# Altium integrated library Connectors.IntLib: 512 symbols (part 1 of 2)
Pins are listed as number, name and electrical type; pins without a type are passive.

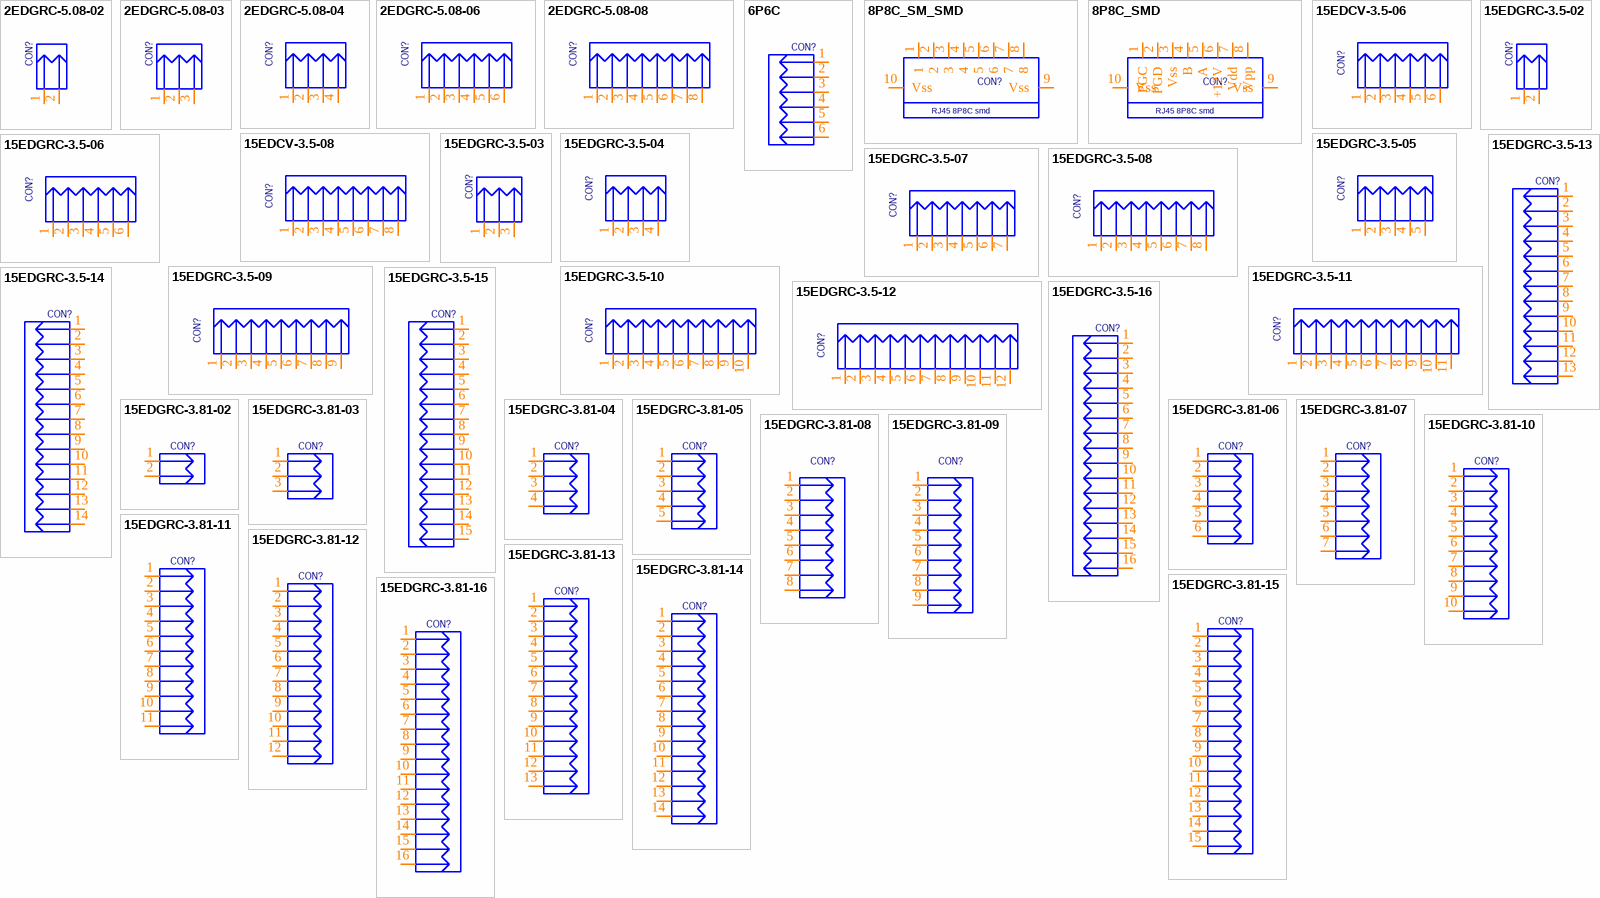
[diagram p0: symbols 2EDGRC-5.08-02 to 15EDGRC-3.81-16]

## 2EDGRC-5.08-02
designator CON?  (value not drawn)
Value: 2EDGRC-5.08-02; Pricing Аlternative: 0.006; Note: Connector; Temp.Characteristic: -40C to +85C; Voltage: 300 V; Package / Case: 5.08 mm; PartNumber Digi-Key: 2EDGRC-5.08-02; Pricing Digi-Key: 0.064; Publisher: Catcatcat Electronics; Website developer: http://catcatcat.d-lan.dp.ua/; Assembly type: Manual Part
footprint 8113/S02-D
pins: 1, 2

## 2EDGRC-5.08-03
designator CON?  (value not drawn)
Value: 2EDGRC-5.08-03; Note: Connector; Temp.Characteristic: -40C to +85C; Voltage: 300 V; Package / Case: 5.08 mm; PartNumber Digi-Key: 2EDGRC-5.08-03; Pricing Digi-Key: 0.10; Publisher: Catcatcat Electronics; Website developer: http://catcatcat.d-lan.dp.ua/; Assembly type: Manual Part
footprint 8113/S03-D
pins: 1, 2, 3

## 2EDGRC-5.08-04
designator CON?  (value not drawn)
Value: 2EDGRC-5.08-04; Note: Connector; Temp.Characteristic: -40C to +85C; Voltage: 300 V; Package / Case: 5.08 mm; PartNumber Digi-Key: 2EDGRC-5.08-04; Pricing Digi-Key: 0.15; Publisher: Catcatcat Electronics; Website developer: http://catcatcat.d-lan.dp.ua/; Assembly type: Manual Part
footprint 8113/S04-D
pins: 1, 2, 3, 4

## 2EDGRC-5.08-06
designator CON?  (value not drawn)
Value: 2EDGRC-5.08-06; Pricing Аlternative: 0.02; Note: Connector; Temp.Characteristic: -40C to +85C; Voltage: 300 V; Dealer Аlternative: http://www.kosmodrom.com.ua; Package / Case: 5.08 mm; PartNumber Digi-Key: 2EDGRC-5.08-06; Pricing Digi-Key: 0.21; Publisher: Catcatcat Electronics; Website developer: http://catcatcat.d-lan.dp.ua/; Assembly type: Manual Part
footprint 8113/S06-D_2+2+2
footprint 8113/S06-D_3+3
pins: 1, 2, 3, 4, 5, 6

## 2EDGRC-5.08-08
designator CON?  (value not drawn)
Value: 2EDGRC-5.08-08; Note: Connector; Temp.Characteristic: -40C to +85C; Voltage: 300 V; Package / Case: 5.08 mm; PartNumber Digi-Key: 2EDGRC-5.08-08; Publisher: Catcatcat Electronics; Website developer: http://catcatcat.d-lan.dp.ua/; Assembly type: Manual Part
footprint 8113/S08-D_2+2+2+2
pins: 1, 2, 3, 4, 5, 6, 7, 8

## 6P6C
designator CON?  (value not drawn)
Note: Connector; Temp.Characteristic: -40C to +85C; Value: *; Publisher: Catcatcat Electronics; Website developer: http://catcatcat.d-lan.dp.ua/; Assembly type: Manual Part
footprint 6P6C
pins: 1, 2, 3, 4, 5, 6

## 8P8C_SM_SMD
designator CON?  (value not drawn)
Note: Connector; Temp.Characteristic: -40C to +85C; Value: *; Publisher: Catcatcat Electronics; Website developer: http://catcatcat.d-lan.dp.ua/; Assembly type: Manual Part
footprint 8P8C_SMD
pins: 1, 2, 3, 4, 5, 6, 7, 8, 9 Vss, 10 Vss
text: RJ45 8P8C smd

## 8P8C_SMD
designator CON?  (value not drawn)
Note: Connector; Temp.Characteristic: -40C to +85C; Value: *; Publisher: Catcatcat Electronics; Website developer: http://catcatcat.d-lan.dp.ua/; Assembly type: Manual Part
footprint 8P8C_SMD
pins: 1 PGC, 2 PGD, 3 Vss, 4 B, 5 A, 6 +12V, 7 Vdd, 8 Vpp, 9 Vss, 10 Vss
text: RJ45 8P8C smd

## 15EDCV-3.5-06
designator CON?  (value not drawn)
Value: 15EDCV-3.5-06; Note: Connector; Temp.Characteristic: -40C to +85C; Package / Case: 3.5 mm; PartNumber Digi-Key: 15EDCV-3.5-06; Publisher: Catcatcat Electronics; Website developer: http://catcatcat.d-lan.dp.ua/; Assembly type: Manual Part
footprint 15EDCV-3.5-06
pins: 1, 2, 3, 4, 5, 6

## 15EDCV-3.5-08
designator CON?  (value not drawn)
Value: 15EDCV-3.5-08; Note: Connector; Temp.Characteristic: -40C to +85C; Package / Case: 3.5 mm; PartNumber Digi-Key: 15EDCV-3.5-08; Publisher: Catcatcat Electronics; Website developer: http://catcatcat.d-lan.dp.ua/; Assembly type: Manual Part
footprint 15EDCV-3.5-08
pins: 1, 2, 3, 4, 5, 6, 7, 8

## 15EDGRC-3.5-02
designator CON?  (value not drawn)
300 V 8 A; Value: 15EDGR-3.5-02; Pricing Аlternative: 0.013; Note: Connector; Temp.Characteristic: -40C to +85C; ComponentLink2URL: http://www.kosmodrom.com.ua/pdf/15EDGRC-35.pdf; Dealer Digi-Key: https://detail.1688.com/offer/539193088710.html; Package / Case: 3.5 mm; PartNumber Digi-Key: 15EDGR-3.5-02; Pricing Digi-Key: 0.0506; Publisher: Catcatcat Electronics; Voltage: 300 V 8 A; Website developer: http://catcatcat.d-lan.dp.ua/; Assembly type: Manual Part
footprint 15EDGR-3.5-02
pins: 1, 2

## 15EDGRC-3.5-03
designator CON?  (value not drawn)
300 V 8 A; Value: 15EDGR-3.5-03; Pricing Аlternative: 0.020; Note: Connector; Temp.Characteristic: -40C to +85C; ComponentLink2URL: http://www.kosmodrom.com.ua/pdf/15EDGRC-35.pdf; Dealer Digi-Key: https://detail.1688.com/offer/539192620837.html; Package / Case: 3.5 mm; PartNumber Digi-Key: 15EDGR-3.5-03; Pricing Digi-Key: 0.077; Publisher: Catcatcat Electronics; Voltage: 300 V 8 A; Website developer: http://catcatcat.d-lan.dp.ua/; Assembly type: Manual Part
footprint 15EDGR-3.5-03
pins: 1, 2, 3

## 15EDGRC-3.5-04
designator CON?  (value not drawn)
300 V 8 A; Value: 15EDGR-3.5-04; Note: Connector; Temp.Characteristic: -40C to +85C; Package / Case: 3.5 mm; PartNumber Digi-Key: 15EDGR-3.5-04; Publisher: Catcatcat Electronics; Voltage: 300 V 8 A; Website developer: http://catcatcat.d-lan.dp.ua/; Assembly type: Manual Part
footprint 15EDGR-3.5-04
pins: 1, 2, 3, 4

## 15EDGRC-3.5-05
designator CON?  (value not drawn)
300 V 8 A; Value: 15EDGR-3.5-05; Note: Connector; Temp.Characteristic: -40C to +85C; Package / Case: 3.5 mm; PartNumber Digi-Key: 15EDGR-3.5-05; Publisher: Catcatcat Electronics; Voltage: 300 V 8 A; Website developer: http://catcatcat.d-lan.dp.ua/; Assembly type: Manual Part
footprint 15EDGR-3.5-05
pins: 1, 2, 3, 4, 5

## 15EDGRC-3.5-06
designator CON?  (value not drawn)
300 V 8 A; Value: 15EDGR-3.5-06; Pricing Аlternative: 0.026; Note: Connector; Temp.Characteristic: -40C to +85C; ComponentLink1URL: http://www.nb-lf.com/en/index.asp; Dealer Digi-Key: https://detail.1688.com/offer/44273896500.html; Package / Case: 3.5 mm; PartNumber Digi-Key: 15EDGR-3.5-06; Pricing Digi-Key: 0.18; Publisher: Catcatcat Electronics; Voltage: 300 V 8 A; Website developer: http://catcatcat.d-lan.dp.ua/; Assembly type: Manual Part
footprint 15EDGR-3.5-06
pins: 1, 2, 3, 4, 5, 6

## 15EDGRC-3.5-07
designator CON?  (value not drawn)
300 V 8 A; Value: 15EDGR-3.5-07; Note: Connector; Temp.Characteristic: -40C to +85C; Package / Case: 3.5 mm; PartNumber Digi-Key: 15EDGR-3.5-07; Publisher: Catcatcat Electronics; Voltage: 300 V 8 A; Website developer: http://catcatcat.d-lan.dp.ua/; Assembly type: Manual Part
footprint 15EDGR-3.5-07
pins: 1, 2, 3, 4, 5, 6, 7

## 15EDGRC-3.5-08
designator CON?  (value not drawn)
300 V 8 A; Value: 15EDGR-3.5-08; Pricing Аlternative: 0.054; Note: Connector; Temp.Characteristic: -40C to +85C; Dealer Digi-Key: https://detail.1688.com/offer/40548719322.html; Package / Case: 3.5 mm; PartNumber Digi-Key: 15EDGR-3.5-08; Pricing Digi-Key: 0.29; Publisher: Catcatcat Electronics; Voltage: 300 V 8 A; Website developer: http://catcatcat.d-lan.dp.ua/; Assembly type: Manual Part
footprint 15EDGR-3.5-08
pins: 1, 2, 3, 4, 5, 6, 7, 8

## 15EDGRC-3.5-09
designator CON?  (value not drawn)
300 V 8 A; Value: 15EDGR-3.5-09; Note: Connector; Temp.Characteristic: -40C to +85C; Package / Case: 3.5 mm; PartNumber Digi-Key: 15EDGR-3.5-09; Publisher: Catcatcat Electronics; Voltage: 300 V 8 A; Website developer: http://catcatcat.d-lan.dp.ua/; Assembly type: Manual Part
footprint 15EDGR-3.5-09
pins: 1, 2, 3, 4, 5, 6, 7, 8, 9

## 15EDGRC-3.5-10
designator CON?  (value not drawn)
300 V 8 A; Value: 15EDGRC-3.5-10; Pricing Аlternative: 0.054; Note: Connector; Temp.Characteristic: -40C to +85C; Package / Case: 3.5 mm; PartNumber Digi-Key: 15EDGR-3.5-10; Pricing Digi-Key: 0.31; Publisher: Catcatcat Electronics; Voltage: 300 V 8 A; Website developer: http://catcatcat.d-lan.dp.ua/; Assembly type: Manual Part
footprint 15EDGR-3.5-10
pins: 1, 2, 3, 4, 5, 6, 7, 8, 9, 10

## 15EDGRC-3.5-11
designator CON?  (value not drawn)
300 V 8 A; Value: 15EDGR-3.5-11; Note: Connector; Temp.Characteristic: -40C to +85C; Package / Case: 3.5 mm; PartNumber Digi-Key: 15EDGR-3.5-11; Publisher: Catcatcat Electronics; Voltage: 300 V 8 A; Website developer: http://catcatcat.d-lan.dp.ua/; Assembly type: Manual Part
footprint 15EDGR-3.5-11
pins: 1, 2, 3, 4, 5, 6, 7, 8, 9, 10, 11

## 15EDGRC-3.5-12
designator CON?  (value not drawn)
300 V 8 A; Value: 15EDGR-3.5-12; Note: Connector; Temp.Characteristic: -40C to +85C; Package / Case: 3.5 mm; PartNumber Digi-Key: 15EDGR-3.5-12; Publisher: Catcatcat Electronics; Voltage: 300 V 8 A; Website developer: http://catcatcat.d-lan.dp.ua/; Assembly type: Manual Part
footprint 15EDGR-3.5-12
pins: 1, 2, 3, 4, 5, 6, 7, 8, 9, 10, 11, 12

## 15EDGRC-3.5-13
designator CON?  (value not drawn)
Value: 15EDGR-3.5-13; Note: Connector; Temp.Characteristic: -40C to +85C; Package / Case: 3.5 mm; PartNumber Digi-Key: 15EDGR-3.5-13; Publisher: Catcatcat Electronics; Website developer: http://catcatcat.d-lan.dp.ua/; Assembly type: Manual Part
footprint 15EDGR-3.5-13
pins: 1, 2, 3, 4, 5, 6, 7, 8, 9, 10, 11, 12, 13

## 15EDGRC-3.5-14
designator CON?  (value not drawn)
Value: 15EDGR-3.5-14; Note: Connector; Temp.Characteristic: -40C to +85C; Package / Case: 3.5 mm; PartNumber Digi-Key: 15EDGR-3.5-14; Publisher: Catcatcat Electronics; Website developer: http://catcatcat.d-lan.dp.ua/; Assembly type: Manual Part
footprint 15EDGR-3.5-14
pins: 1, 2, 3, 4, 5, 6, 7, 8, 9, 10, 11, 12, 13, 14

## 15EDGRC-3.5-15
designator CON?  (value not drawn)
Value: 15EDGR-3.5-15; Note: Connector; Temp.Characteristic: -40C to +85C; Package / Case: 3.5 mm; PartNumber Digi-Key: 15EDGR-3.5-15; Publisher: Catcatcat Electronics; Website developer: http://catcatcat.d-lan.dp.ua/; Assembly type: Manual Part
footprint 15EDGR-3.5-15
pins: 1, 2, 3, 4, 5, 6, 7, 8, 9, 10, 11, 12, 13, 14, 15

## 15EDGRC-3.5-16
designator CON?  (value not drawn)
Value: 15EDGR-3.5-16; Note: Connector; Temp.Characteristic: -40C to +85C; Package / Case: 3.5 mm; PartNumber Digi-Key: 15EDGR-3.5-16; Publisher: Catcatcat Electronics; Website developer: http://catcatcat.d-lan.dp.ua/; Assembly type: Manual Part
footprint 15EDGR-3.5-16
pins: 1, 2, 3, 4, 5, 6, 7, 8, 9, 10, 11, 12, 13, 14, 15, 16

## 15EDGRC-3.81-02
designator CON?  (value not drawn)
Note: Connector; Temp.Characteristic: -40C to +85C; Value: *; Publisher: Catcatcat Electronics; Website developer: http://catcatcat.d-lan.dp.ua/; Assembly type: Manual Part
footprint 15EDGR-3.81-02
pins: 1, 2

## 15EDGRC-3.81-03
designator CON?  (value not drawn)
Note: Connector; Temp.Characteristic: -40C to +85C; Value: *; Publisher: Catcatcat Electronics; Website developer: http://catcatcat.d-lan.dp.ua/; Assembly type: Manual Part
footprint 15EDGR-3.81-03
pins: 1, 2, 3

## 15EDGRC-3.81-04
designator CON?  (value not drawn)
Note: Connector; Temp.Characteristic: -40C to +85C; Value: *; Publisher: Catcatcat Electronics; Website developer: http://catcatcat.d-lan.dp.ua/; Assembly type: Manual Part
footprint 15EDGR-3.81-04
pins: 1, 2, 3, 4

## 15EDGRC-3.81-05
designator CON?  (value not drawn)
Note: Connector; Temp.Characteristic: -40C to +85C; Value: *; Publisher: Catcatcat Electronics; Website developer: http://catcatcat.d-lan.dp.ua/; Assembly type: Manual Part
footprint 15EDGR-3.81-05
pins: 1, 2, 3, 4, 5

## 15EDGRC-3.81-06
designator CON?  (value not drawn)
Note: Connector; Temp.Characteristic: -40C to +85C; Value: *; Publisher: Catcatcat Electronics; Website developer: http://catcatcat.d-lan.dp.ua/; Assembly type: Manual Part
footprint 15EDGR-3.81-06
pins: 1, 2, 3, 4, 5, 6

## 15EDGRC-3.81-07
designator CON?  (value not drawn)
Note: Connector; Temp.Characteristic: -40C to +85C; Value: *; Publisher: Catcatcat Electronics; Website developer: http://catcatcat.d-lan.dp.ua/; Assembly type: Manual Part
footprint 15EDGR-3.81-07
pins: 1, 2, 3, 4, 5, 6, 7

## 15EDGRC-3.81-08
designator CON?  (value not drawn)
Note: Connector; Temp.Characteristic: -40C to +85C; Value: *; Publisher: Catcatcat Electronics; Website developer: http://catcatcat.d-lan.dp.ua/; Assembly type: Manual Part
footprint 15EDGR-3.81-08
pins: 1, 2, 3, 4, 5, 6, 7, 8

## 15EDGRC-3.81-09
designator CON?  (value not drawn)
Note: Connector; Temp.Characteristic: -40C to +85C; Value: *; Publisher: Catcatcat Electronics; Website developer: http://catcatcat.d-lan.dp.ua/; Assembly type: Manual Part
footprint 15EDGR-3.81-09
pins: 1, 2, 3, 4, 5, 6, 7, 8, 9

## 15EDGRC-3.81-10
designator CON?  (value not drawn)
Note: Connector; Temp.Characteristic: -40C to +85C; Value: *; Publisher: Catcatcat Electronics; Website developer: http://catcatcat.d-lan.dp.ua/; Assembly type: Manual Part
footprint 15EDGR-3.81-10
pins: 1, 2, 3, 4, 5, 6, 7, 8, 9, 10

## 15EDGRC-3.81-11
designator CON?  (value not drawn)
Note: Connector; Temp.Characteristic: -40C to +85C; Value: *; Publisher: Catcatcat Electronics; Website developer: http://catcatcat.d-lan.dp.ua/; Assembly type: Manual Part
footprint 15EDGR-3.81-11
pins: 1, 2, 3, 4, 5, 6, 7, 8, 9, 10, 11

## 15EDGRC-3.81-12
designator CON?  (value not drawn)
Note: Connector; Temp.Characteristic: -40C to +85C; Value: *; Publisher: Catcatcat Electronics; Website developer: http://catcatcat.d-lan.dp.ua/; Assembly type: Manual Part
footprint 15EDGR-3.81-12
pins: 1, 2, 3, 4, 5, 6, 7, 8, 9, 10, 11, 12

## 15EDGRC-3.81-13
designator CON?  (value not drawn)
Note: Connector; Temp.Characteristic: -40C to +85C; Value: *; Publisher: Catcatcat Electronics; Website developer: http://catcatcat.d-lan.dp.ua/; Assembly type: Manual Part
footprint 15EDGR-3.81-13
pins: 1, 2, 3, 4, 5, 6, 7, 8, 9, 10, 11, 12, 13

## 15EDGRC-3.81-14
designator CON?  (value not drawn)
Note: Connector; Temp.Characteristic: -40C to +85C; Value: *; Publisher: Catcatcat Electronics; Website developer: http://catcatcat.d-lan.dp.ua/; Assembly type: Manual Part
footprint 15EDGR-3.81-14
pins: 1, 2, 3, 4, 5, 6, 7, 8, 9, 10, 11, 12, 13, 14

## 15EDGRC-3.81-15
designator CON?  (value not drawn)
Note: Connector; Temp.Characteristic: -40C to +85C; Value: *; Publisher: Catcatcat Electronics; Website developer: http://catcatcat.d-lan.dp.ua/; Assembly type: Manual Part
footprint 15EDGR-3.81-15
pins: 1, 2, 3, 4, 5, 6, 7, 8, 9, 10, 11, 12, 13, 14, 15

## 15EDGRC-3.81-16
designator CON?  (value not drawn)
Note: Connector; Temp.Characteristic: -40C to +85C; Value: *; Publisher: Catcatcat Electronics; Website developer: http://catcatcat.d-lan.dp.ua/; Assembly type: Manual Part
footprint 15EDGR-3.81-16
pins: 1, 2, 3, 4, 5, 6, 7, 8, 9, 10, 11, 12, 13, 14, 15, 16

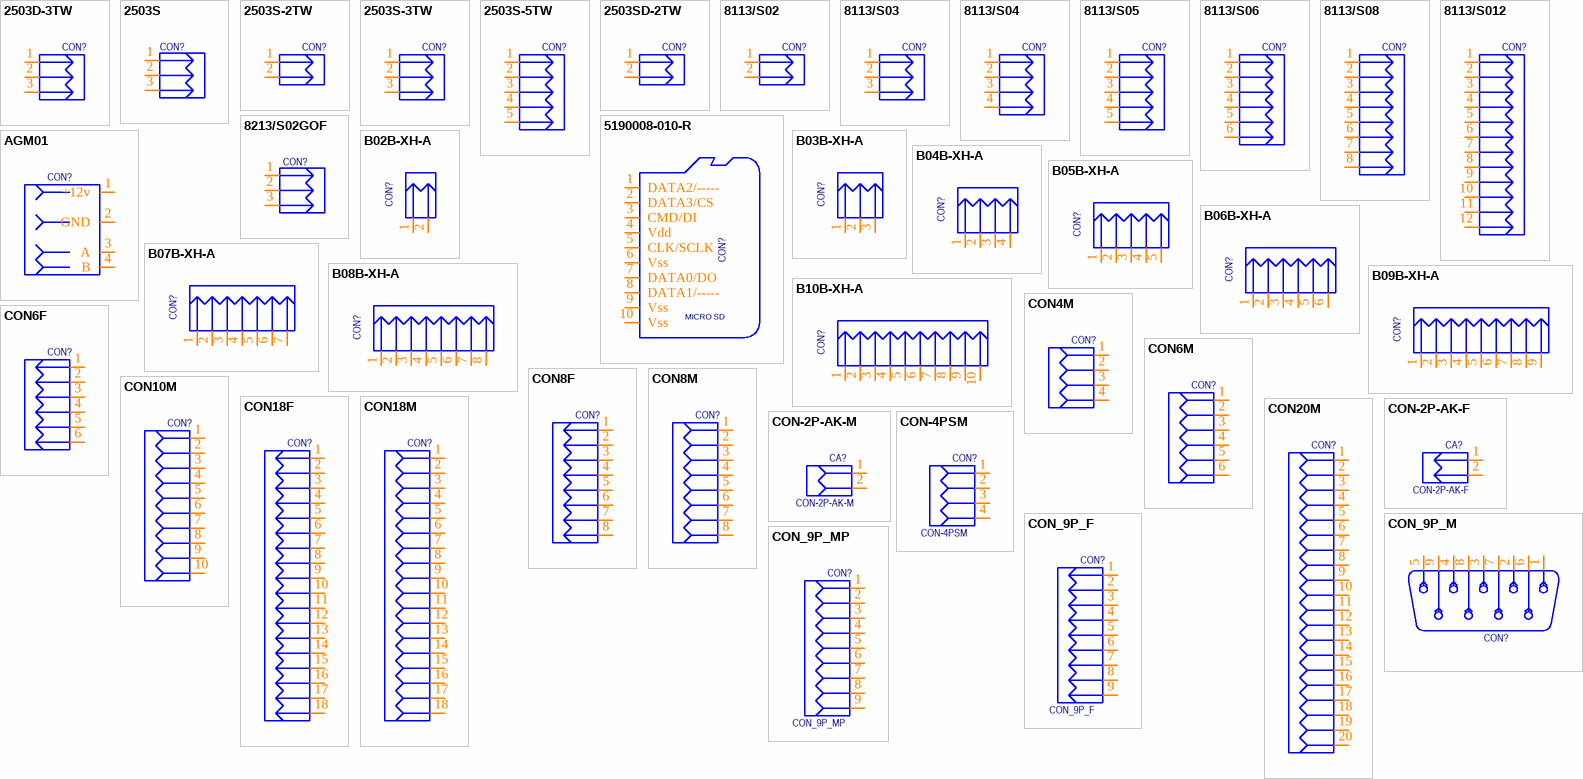
[diagram p1: symbols 2503D-3TW to CON_9P_MP]

## 2503D-3TW
designator CON?  (value not drawn)
Note: Connector; Temp.Characteristic: -40C to +85C; Value: *; Publisher: Catcatcat Electronics; Website developer: http://catcatcat.d-lan.dp.ua/; Assembly type: Manual Part
footprint 2503D-3TW
pins: 1, 2, 3

## 2503S
designator CON?  (value not drawn)
Note: Connector; Temp.Characteristic: -40C to +85C; Value: *; Publisher: Catcatcat Electronics; Website developer: http://catcatcat.d-lan.dp.ua/; Assembly type: Manual Part
footprint 2503S
pins: 1, 2, 3

## 2503S-2TW
designator CON?  (value not drawn)
Note: Connector; Temp.Characteristic: -40C to +85C; Value: *; Publisher: Catcatcat Electronics; Website developer: http://catcatcat.d-lan.dp.ua/; Assembly type: Manual Part
footprint 2503S-2TW
pins: 1, 2

## 2503S-3TW
designator CON?  (value not drawn)
Note: Connector; Temp.Characteristic: -40C to +85C; Value: *; Publisher: Catcatcat Electronics; Website developer: http://catcatcat.d-lan.dp.ua/; Assembly type: Manual Part
footprint 2503S-3TW
pins: 1, 2, 3

## 2503S-5TW
designator CON?  (value not drawn)
Note: Connector; Temp.Characteristic: -40C to +85C; Value: *; Publisher: Catcatcat Electronics; Website developer: http://catcatcat.d-lan.dp.ua/; Assembly type: Manual Part
footprint 2503S-5TW
pins: 1, 2, 3, 4, 5

## 2503SD-2TW
designator CON?  (value not drawn)
Note: Connector; Temp.Characteristic: -40C to +85C; Value: *; Publisher: Catcatcat Electronics; Website developer: http://catcatcat.d-lan.dp.ua/; Assembly type: Manual Part
footprint 2503SD-2TW
pins: 1, 2

## 8113/S02
designator CON?  (value not drawn)
Note: Connector; Temp.Characteristic: -40C to +85C; Value: *; Publisher: Catcatcat Electronics; Website developer: http://catcatcat.d-lan.dp.ua/; Assembly type: Manual Part
footprint 8113/S02
pins: 1, 2

## 8113/S03
designator CON?  (value not drawn)
Note: Connector; Temp.Characteristic: -40C to +85C; Value: *; Publisher: Catcatcat Electronics; Website developer: http://catcatcat.d-lan.dp.ua/; Assembly type: Manual Part
footprint 8113/S03
pins: 1, 2, 3

## 8113/S04
designator CON?  (value not drawn)
Note: Connector; Temp.Characteristic: -40C to +85C; Value: *; Publisher: Catcatcat Electronics; Website developer: http://catcatcat.d-lan.dp.ua/; Assembly type: Manual Part
footprint 8113/S04
pins: 1, 2, 3, 4

## 8113/S05
designator CON?  (value not drawn)
Note: Connector; Temp.Characteristic: -40C to +85C; Value: *; Publisher: Catcatcat Electronics; Website developer: http://catcatcat.d-lan.dp.ua/; Assembly type: Manual Part
footprint 8113/S05
pins: 1, 2, 3, 4, 5

## 8113/S06
designator CON?  (value not drawn)
Note: Connector; Temp.Characteristic: -40C to +85C; Value: *; Publisher: Catcatcat Electronics; Website developer: http://catcatcat.d-lan.dp.ua/; Assembly type: Manual Part
footprint 8113/S06
pins: 1, 2, 3, 4, 5, 6

## 8113/S08
designator CON?  (value not drawn)
Note: Connector; Temp.Characteristic: -40C to +85C; Value: *; Publisher: Catcatcat Electronics; Website developer: http://catcatcat.d-lan.dp.ua/; Assembly type: Manual Part
footprint 8113/S08
pins: 1, 2, 3, 4, 5, 6, 7, 8

## 8113/S012
designator CON?  (value not drawn)
Note: Connector; Temp.Characteristic: -40C to +85C; Value: *; Publisher: Catcatcat Electronics; Website developer: http://catcatcat.d-lan.dp.ua/; Assembly type: Manual Part
footprint 8113/S012
pins: 1, 2, 3, 4, 5, 6, 7, 8, 9, 10, 11, 12

## 8213/S02GOF
designator CON?  (value not drawn)
Note: Connector; Temp.Characteristic: -40C to +85C; Value: *; Publisher: Catcatcat Electronics; Website developer: http://catcatcat.d-lan.dp.ua/; Assembly type: Manual Part
footprint 8213/S02GOF
pins: 1, 2, 3

## 5190008-010-R
designator CON?  (value not drawn)
Note: Connector; Temp.Characteristic: -40C to +85C; Value: *; Publisher: Catcatcat Electronics; Website developer: http://catcatcat.d-lan.dp.ua/; Assembly type: Manual Part
footprint 5190008-010-R
pins: 1 DATA2/-----, 2 DATA3/CS, 3 CMD/DI, 4 Vdd, 5 CLK/SCLK, 6 Vss, 7 DATA0/DO, 8 DATA1/-----, 9 Vss, 10 Vss
text: MICRO SD

## AGM01
designator CON?  (value not drawn)
Note: Connector; Temp.Characteristic: -40C to +85C; Value: *; Publisher: Catcatcat Electronics; Website developer: http://catcatcat.d-lan.dp.ua/; Assembly type: Manual Part
footprint AGM01
pins: 1 +12v, 2 GND, 3 A, 4 B

## B02B-XH-A
designator CON?  (value not drawn)
3 A 250 V 2.5 mm; Value: B02B-XH-A; Pricing Аlternative: 0.029; Note: Connector; Temp.Characteristic: -40C to +85C; ComponentLink1URL: http://www.jst-mfg.com; ComponentLink2URL: http://www.jst-mfg.com/product/images/pdf.gif; Dealer Digi-Key: https://detail.1688.com/offer/38233239228.html; Package / Case: 2.5 mm; PartNumber Digi-Key: B02B-XH-A; Pricing Digi-Key: 0.1; Publisher: Catcatcat Electronics; Voltage: 3 A 250 V 2.5 mm; Website developer: http://catcatcat.d-lan.dp.ua/; Assembly type: Manual Part
footprint B02B-XH-A
pins: 1, 2

## B03B-XH-A
designator CON?  (value not drawn)
3 A 250 V 2.5 mm; Value: B03B-XH-A; Pricing Аlternative: 0.029; Note: Connector; Temp.Characteristic: -40C to +85C; ComponentLink1URL: http://www.jst-mfg.com; ComponentLink2URL: http://www.jst-mfg.com/product/images/pdf.gif; Dealer Digi-Key: https://detail.1688.com/offer/38233239228.html; Package / Case: 2.5 mm; PartNumber Digi-Key: B03B-XH-A; Pricing Digi-Key: 0.1; Publisher: Catcatcat Electronics; Voltage: 3 A 250 V 2.5 mm; Website developer: http://catcatcat.d-lan.dp.ua/; Assembly type: Manual Part
footprint B03B-XH-A
pins: 1, 2, 3

## B04B-XH-A
designator CON?  (value not drawn)
3 A 250 V 2.5 mm; Value: B04B-XH-A; Pricing Аlternative: 0.029; Note: Connector; Temp.Characteristic: -40C to +85C; ComponentLink1URL: http://www.jst-mfg.com; ComponentLink2URL: http://www.jst-mfg.com/product/images/pdf.gif; Dealer Digi-Key: https://detail.1688.com/offer/38233239228.html; Package / Case: 2.5 mm; PartNumber Digi-Key: B04B-XH-A; Pricing Digi-Key: 0.1; Publisher: Catcatcat Electronics; Voltage: 3 A 250 V 2.5 mm; Website developer: http://catcatcat.d-lan.dp.ua/; Assembly type: Manual Part
footprint B04B-XH-A
pins: 1, 2, 3, 4

## B05B-XH-A
designator CON?  (value not drawn)
3 A 250 V 2.5 mm; Value: B05B-XH-A; Pricing Аlternative: 0.029; Note: Connector; Temp.Characteristic: -40C to +85C; ComponentLink1URL: http://www.jst-mfg.com; ComponentLink2URL: http://www.jst-mfg.com/product/images/pdf.gif; Dealer Digi-Key: https://detail.1688.com/offer/38233239228.html; Package / Case: 2.5 mm; PartNumber Digi-Key: B05B-XH-A; Pricing Digi-Key: 0.1; Publisher: Catcatcat Electronics; Voltage: 3 A 250 V 2.5 mm; Website developer: http://catcatcat.d-lan.dp.ua/; Assembly type: Manual Part
footprint B05B-XH-A
pins: 1, 2, 3, 4, 5

## B06B-XH-A
designator CON?  (value not drawn)
3 A 250 V 2.5 mm; Value: B06B-XH-A; Pricing Аlternative: 0.029; Note: Connector; Temp.Characteristic: -40C to +85C; ComponentLink1URL: http://www.jst-mfg.com; ComponentLink2URL: http://www.jst-mfg.com/product/images/pdf.gif; Dealer Digi-Key: https://detail.1688.com/offer/38233239228.html; Package / Case: 2.5 mm; PartNumber Digi-Key: B06B-XH-A; Pricing Digi-Key: 0.1; Publisher: Catcatcat Electronics; Voltage: 3 A 250 V 2.5 mm; Website developer: http://catcatcat.d-lan.dp.ua/; Assembly type: Manual Part
footprint B06B-XH-A
pins: 1, 2, 3, 4, 5, 6

## B07B-XH-A
designator CON?  (value not drawn)
3 A 250 V 2.5 mm; Value: B07B-XH-A; Pricing Аlternative: 0.029; Note: Connector; Temp.Characteristic: -40C to +85C; ComponentLink1URL: http://www.jst-mfg.com; ComponentLink2URL: http://www.jst-mfg.com/product/images/pdf.gif; Dealer Digi-Key: https://detail.1688.com/offer/38233239228.html; Package / Case: 2.5 mm; PartNumber Digi-Key: B07B-XH-A; Pricing Digi-Key: 0.1; Publisher: Catcatcat Electronics; Voltage: 3 A 250 V 2.5 mm; Website developer: http://catcatcat.d-lan.dp.ua/; Assembly type: Manual Part
footprint B07B-XH-A
pins: 1, 2, 3, 4, 5, 6, 7

## B08B-XH-A
designator CON?  (value not drawn)
3 A 250 V 2.5 mm; Value: B08B-XH-A; Pricing Аlternative: 0.029; Note: Connector; Temp.Characteristic: -40C to +85C; ComponentLink1URL: http://www.jst-mfg.com; ComponentLink2URL: http://www.jst-mfg.com/product/images/pdf.gif; Dealer Digi-Key: https://detail.1688.com/offer/38233239228.html; Package / Case: 2.5 mm; PartNumber Digi-Key: B08B-XH-A; Pricing Digi-Key: 0.1; Publisher: Catcatcat Electronics; Voltage: 3 A 250 V 2.5 mm; Website developer: http://catcatcat.d-lan.dp.ua/; Assembly type: Manual Part
footprint B08B-XH-A
pins: 1, 2, 3, 4, 5, 6, 7, 8

## B09B-XH-A
designator CON?  (value not drawn)
3 A 250 V 2.5 mm; Value: B09B-XH-A; Pricing Аlternative: 0.029; Note: Connector; Temp.Characteristic: -40C to +85C; ComponentLink1URL: http://www.jst-mfg.com; ComponentLink2URL: http://www.jst-mfg.com/product/images/pdf.gif; Dealer Digi-Key: https://detail.1688.com/offer/38233239228.html; Package / Case: 2.5 mm; PartNumber Digi-Key: B09B-XH-A; Pricing Digi-Key: 0.1; Publisher: Catcatcat Electronics; Voltage: 3 A 250 V 2.5 mm; Website developer: http://catcatcat.d-lan.dp.ua/; Assembly type: Manual Part
footprint B09B-XH-A
pins: 1, 2, 3, 4, 5, 6, 7, 8, 9
